# Altium footprint library Altium_Lib.PcbLib: 334 footprints (part 11 of 21)
Each footprint in its own frame and in the unit in brackets; x right, y up, seen from the top. Pads: shape width x height; smd on the part's side, far side on the other; paste and mask are expansions set on the pad; w line width, h text height; cw(c..) or ccw(c..) is an arc to the next point about the centre after c.
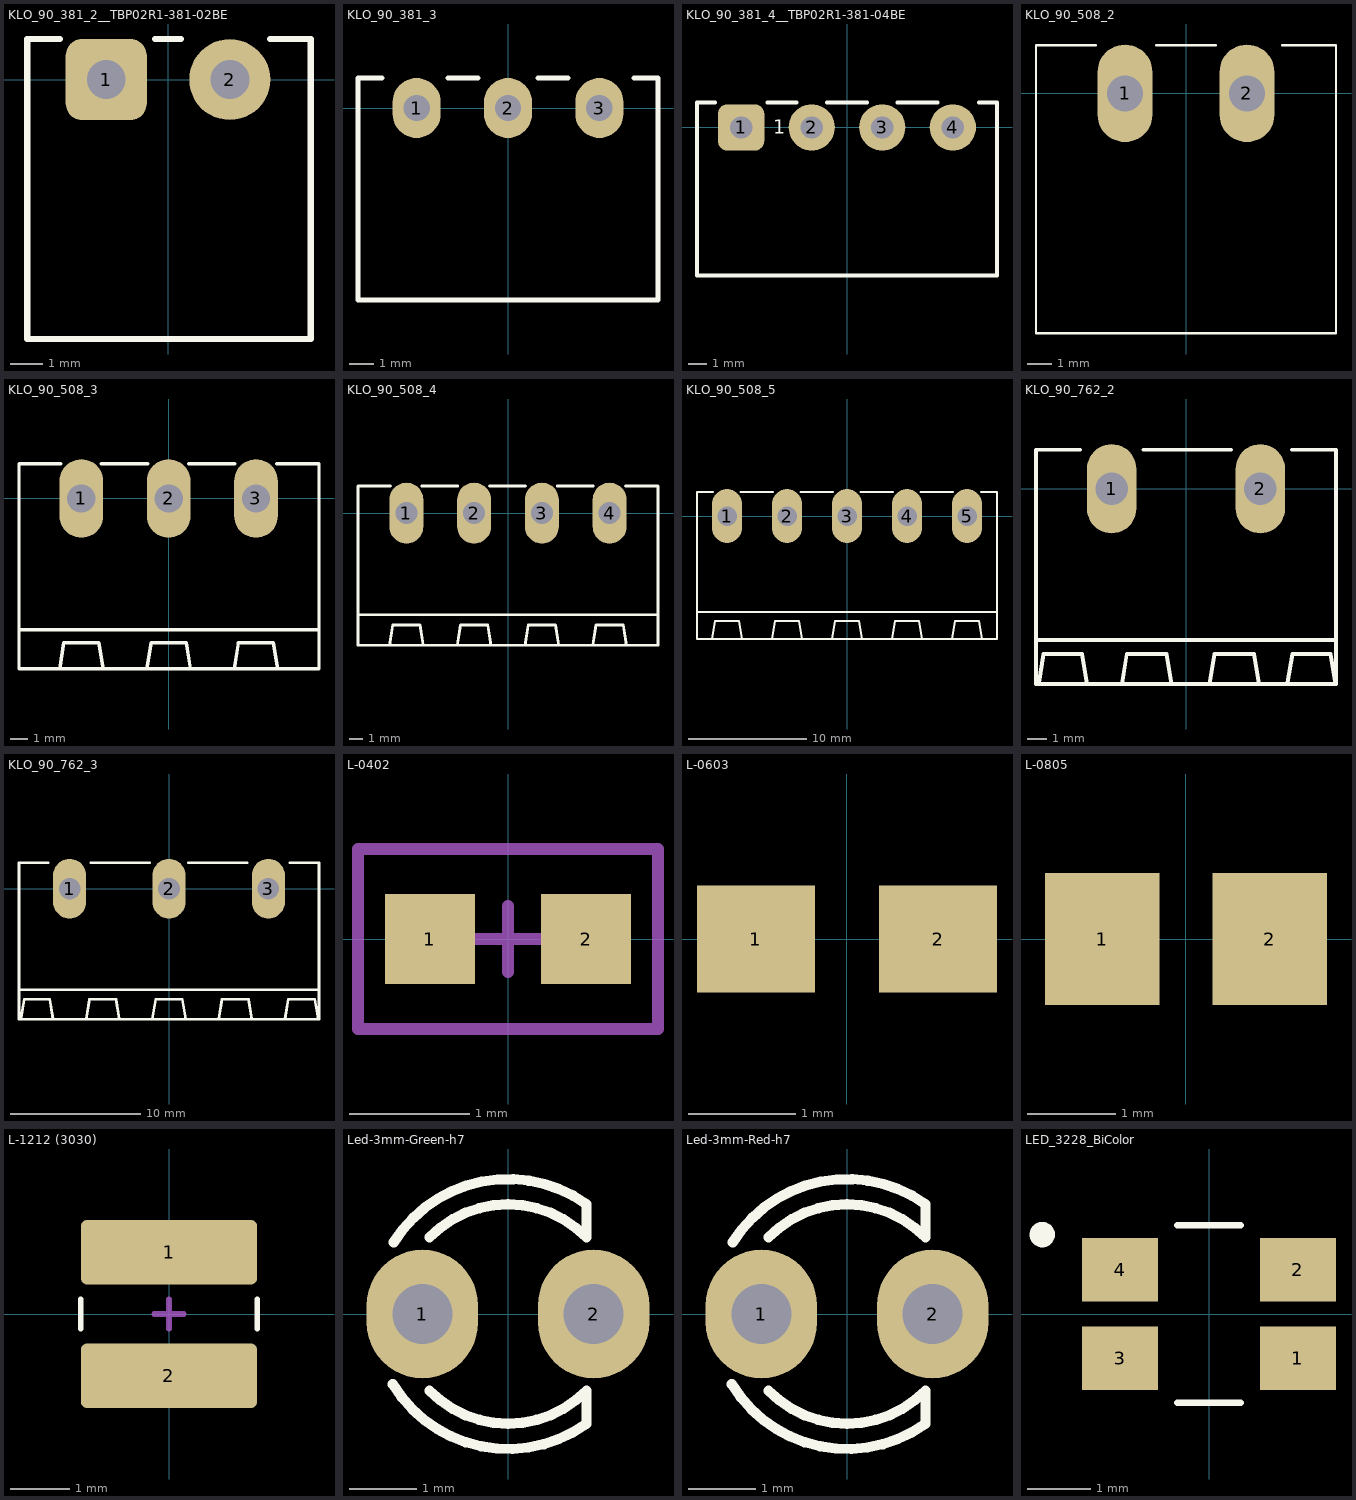
[diagram p10: the footprints below, top view; thin cyan lines are the x and y axes]

## KLO_90_381_2__TBP02R1-381-02BE [mm] "Connector; Header; 2 Position"
height 8.5
pads (2):
  rrect40% 2.5x2.5 hole 1.2: 1(-1.905,0)
  round 2.5 hole 1.2: 2(1.905,0)
Top Overlay:
  lines w0.2: -4.345,-2.274 -4.345,0.647 ; -4.345,-1.5 -4.345,-8 4.405,-8 4.405,-1.5 ; -4.345,0.5 -4.345,1.25 -3.345,1.25 ; -0.4,1.25 0.4,1.25 ; 3.155,1.25 4.405,1.25 4.405,-1.774
3D body "691322310002 (rev1).stp": height 7.2, standoff -3.5, extent -4.4,-8.02 4.41,1.18

## KLO_90_381_3 [mm]
pads (3):
  oval 2x2.5 hole 1.1: 1(-3.81,0) 2(0,0) 3(3.81,0)
Top Overlay:
  lines w0.2: -5.25,1.25 -6.25,1.25 -6.25,1 -6.25,-8 6.25,-8 6.25,-7.75 6.25,1.25 5.25,1.25 ; -2.5,1.25 -1.25,1.25 ; 1.25,1.25 2.5,1.25
3D body "691322310003 (rev1).stp": height 7.3, standoff -3.4, extent -6.31,-7.95 6.31,1.25

## KLO_90_381_4__TBP02R1-381-04BE [mm] "Connector; Header; 4 Position"
height 8.5
pads (4):
  rrect40% 2.5x2.5 hole 1.2: 1(-5.715,0)
  round 2.5 hole 1.2: 2(-1.905,0) 3(1.905,0) 4(5.715,0)
Top Overlay:
  lines w0.2: -8.1,1.346 -8.1,-8 8.1,-8 8.1,1.346 ; -8.1,1.35 -7.125,1.35 ; -4.3,1.35 -2.725,1.35 ; -1.1,1.35 1.075,1.35 ; 2.725,1.35 4.9,1.35 ; 7.125,1.35 8.1,1.35
  text "1" at -3.988,-0.584 h1.27
3D body "CUI_DEVICES_TBP02R1-381-04BE.step": height 7.2, standoff -3.5, extent -7.995,-7.99 8.035,1.21

## KLO_90_508_2 [mil]
height 314.96
pads (2):
  rrect100% 90x160 hole 59.06: 1(-100,0) 2(100,0)
Top Overlay:
  lines w3.94: -147.64,78.74 -246.06,78.74 -246.06,-393.7 246.06,-393.7 246.06,78.74 157.48,78.74 ; -49.21,78.74 49.21,78.74
3D body "395326002.stp": height 130.31, standoff -349.69, extent -238.84,-391.49 240.16,78.51

## KLO_90_508_3 [mil]
pads (3):
  rrect100% 100x180 hole 65: 1(-200,0) 2(0,0) 3(200,0)
Top Overlay:
  lines w8: -342.91,-300.31 344.49,-300.31 ; -250,-390.31 -240,-330.31 -160,-330.31 -150,-390.31 ; -246.85,80 -342.91,80 -342.91,-390.31 344.49,-390.31 344.49,80 ; -154.33,80 -48.03,80 ; -50,-390.31 -40,-330.31 40,-330.31 50,-390.31 ; 45.67,80 151.97,80 ; 150,-390.31 160,-330.31 240,-330.31 250,-390.31 ; 247.64,80 343.7,80
3D body "691313510003 (rev1).stp": height 340.55, standoff -131.89, extent -339.36,-393.69 339.38,78.75

## KLO_90_508_4 [mil]
pads (4):
  rrect100% 100x180 hole 65: 1(-300,0) 2(-100,0) 3(100,0) 4(300,0)
Top Overlay:
  lines w8: -442.91,-300.31 442.91,-300.31 ; -350,-390.31 -340,-330.31 -260,-330.31 -250,-390.31 ; -346.85,80 -442.91,80 -442.91,-390.31 442.91,-390.31 442.91,80 346.85,80 ; -254.33,80 -148.03,80 ; -150,-390.31 -140,-330.31 -60,-330.31 -50,-390.31 ; -54.33,80 51.97,80 ; 50,-390.31 60,-330.31 140,-330.31 150,-390.31 ; 145.67,80 251.97,80 ; 250,-390.31 260,-330.31 340,-330.31 350,-390.31
3D body "Download_STP_691313510004 (rev1).stp": height 352.36, standoff -120.08, extent -439.37,-393.69 439.37,78.75

## KLO_90_508_5 [mil]
height 314.96
pads (5):
  rrect100% 100x180 hole 65: 1(-400,0) 2(-200,0) 3(0,0) 4(200,0) 5(400,0)
Top Overlay:
  lines w8: -500,-320 500,-320 ; -450,-410 -440,-350 -360,-350 -350,-410 ; -446.85,80 -500,80 -500,-410 500,-410 500,80 447.83,80 ; -354.33,80 -248.03,80 ; -250,-410 -240,-350 -160,-350 -150,-410 ; -154.33,80 -48.03,80 ; -50,-410 -40,-350 40,-350 50,-410 ; 45.67,80 151.97,80 ; 150,-410 160,-350 240,-350 250,-410 ; 245.67,80 351.97,80 ; 350,-410 360,-350 440,-350 450,-410
3D body "395325005.stp": height 330, standoff -170, extent -500,-390.51 500,79.49

## KLO_90_762_2 [mm]
pads (2):
  rrect100% 2.54x4.572 hole 1.65: 1(-3.81,0) 2(3.81,0)
Top Overlay:
  lines w0.2: -7.69,-7.75 7.675,-7.75 ; -7.54,-10 -7.69,-10 -7.69,2 -5.44,2 ; 5.06,-10 5.21,-10 ; 5.44,2 7.69,2 7.69,-10
  lines w0.203: -7.54,-10 7.675,-10 ; -7.54,-9.936 -7.297,-8.476 -5.334,-8.476 -5.08,-10 ; -3.29,-10 -3.036,-8.476 -1.004,-8.476 -0.75,-10 ; -2.19,2 2.31,2 ; 1.21,-10 1.464,-8.476 3.496,-8.476 3.75,-10 ; 5.21,-9.936 5.453,-8.476 7.416,-8.476 7.67,-10
3D body "pxc_1728853_02_GMSTBA-2-5-HC-2-G-7-62_3D.stp": height 8.7, standoff -3.4, extent -7.62,-10.002 7.62,2

## KLO_90_762_3 [mm]
pads (3):
  rrect100% 2.54x4.572 hole 1.65: 1(-7.62,0) 2(0,0) 3(7.62,0)
Top Overlay:
  lines w0.2: -11.5,-7.75 11.375,-7.75 ; -11.35,-10 -11.5,-10 -11.5,2 -9.25,2 ; 9.25,2 11.5,2 11.5,-10
  lines w0.203: -11.35,-10 11.375,-10 ; -11.35,-9.936 -11.107,-8.476 -9.144,-8.476 -8.89,-10 ; -6.35,-10 -6.096,-8.476 -4.064,-8.476 -3.81,-10 ; -6,2 -1.5,2 ; -1.27,-10 -1.016,-8.476 1.016,-8.476 1.27,-10 ; 1.5,2 6,2 ; 3.81,-10 4.064,-8.476 6.096,-8.476 6.35,-10 ; 8.89,-10 9.144,-8.476 11.176,-8.476 11.429,-9.991

## L-0402 [mm] "Chip Inductor; Body 1.6 x 0.8 mm (LxW typ)"
height 0.85
pads (2):
  rect 0.75x0.75 smd: 1(-0.65,0) 2(0.65,0)
Mechanical 15:
  lines w0.1: -0.275,0 0.275,0 ; 0,-0.275 0,0.275 ; -1.25,-0.75 -1.25,0.75 1.25,0.75 1.25,-0.75 -1.25,-0.75
3D body "0603_L.step": height 0.75, standoff -0.01, extent -0.762,-0.381 0.762,0.381

## L-0603 [mm] "Chip Inductor; Body 1.6 x 0.8 mm (LxW typ)"
height 0.85
pads (2):
  rect 1.1x1 smd: 1(-0.85,0) 2(0.85,0)
3D body "0603_L.step": height 0.75, standoff -0.01, extent -0.762,-0.381 0.762,0.381

## L-0805 [mm] "Chip Inductor; Body 2.0 x 1.3 mm (LxW typ)"
height 0.65
pads (2):
  rect 1.3x1.5 smd: 1(-0.95,0) 2(0.95,0)
3D body "0805_L.step": height 0.95, standoff 0, extent -1,-0.6 1,0.6

## L-1212 (3030) [mm]
pads (2):
  rrect20% 3x1.1 smd: 1(0,1.05) 2(0,-1.05)
Top Overlay:
  lines w0.1: -1.5,-0.25 -1.5,0.25 ; 1.5,-0.25 1.5,0.25
Mechanical 15:
  lines w0.1: -0.25,0 0.25,0 ; 0,-0.25 0,0.25
3D body "User Library-Murata_LQH3NP_M0(1212).STEP": height 1.4, standoff -0.01, extent -1.51,-1.51 1.49,1.51

## Led-3mm-Green-h7 [mil]
height 216.54
pads (2):
  oval 65x75 hole 35: 1(-50,0) 2(50,0)
Top Overlay:
  lines w6: -67.26,-40.94 ccw(c0,0) 45.79,-64.05 ; -66.72,41.82 cw(c0,0) 45.8,64.05 ; -45.75,-44.75 ccw(c0,0) 45.74,-44.77 45.74,-64.05 ; -45.75,44.75 cw(c0,0) 45.75,44.75 45.75,64.05
3D body: height 149.61, standoff -102.36, extent -61.71,-11.78 -38.18,11.8
3D body: height 149.61, standoff -102.36, extent 38.29,-11.78 61.82,11.8
3D body "LED_3mm_02.step": height 354.33, standoff 31.5, extent -78.1,-78.46 59.06,78.46

## Led-3mm-Red-h7 [mil]
height 216.54
pads (2):
  oval 65x75 hole 35: 1(-50,0) 2(50,0)
Top Overlay:
  lines w6: -67.26,-40.94 ccw(c0,0) 45.79,-64.05 ; -66.72,41.82 cw(c0,0) 45.8,64.05 ; -45.75,-44.75 ccw(c0,0) 45.74,-44.77 45.74,-64.05 ; -45.75,44.75 cw(c0,0) 45.75,44.75 45.75,64.05
3D body "everlight-3MM-LED-RED.STEP": height 261.28, standoff -233.51, extent -74.8,-74.8 60.07,74.8

## LED_3228_BiColor [mm]
pads (4):
  rect 1.2x1 smd: 1(1.4,-0.7) 2(1.4,0.7) 3(-1.4,-0.7) 4(-1.4,0.7)
Top Overlay:
  circle w0.2: c-2.625,1.25 r0.1
  lines w0.1: -0.5,-1.4 0.5,-1.4 ; -0.5,1.4 0.5,1.4
3D body "XZxxxx45.step": height 1.9, standoff 0, extent -1.725,-1.35 1.775,1.45